# Altium footprint library ACR Components.PcbLib: 45 footprints (part 2 of 3)
Each footprint in its own frame and in the unit in brackets; x right, y up, seen from the top. Pads: shape width x height; smd on the part's side, far side on the other; paste and mask are expansions set on the pad; w line width, h text height; cw(c..) or ccw(c..) is an arc to the next point about the centre after c.
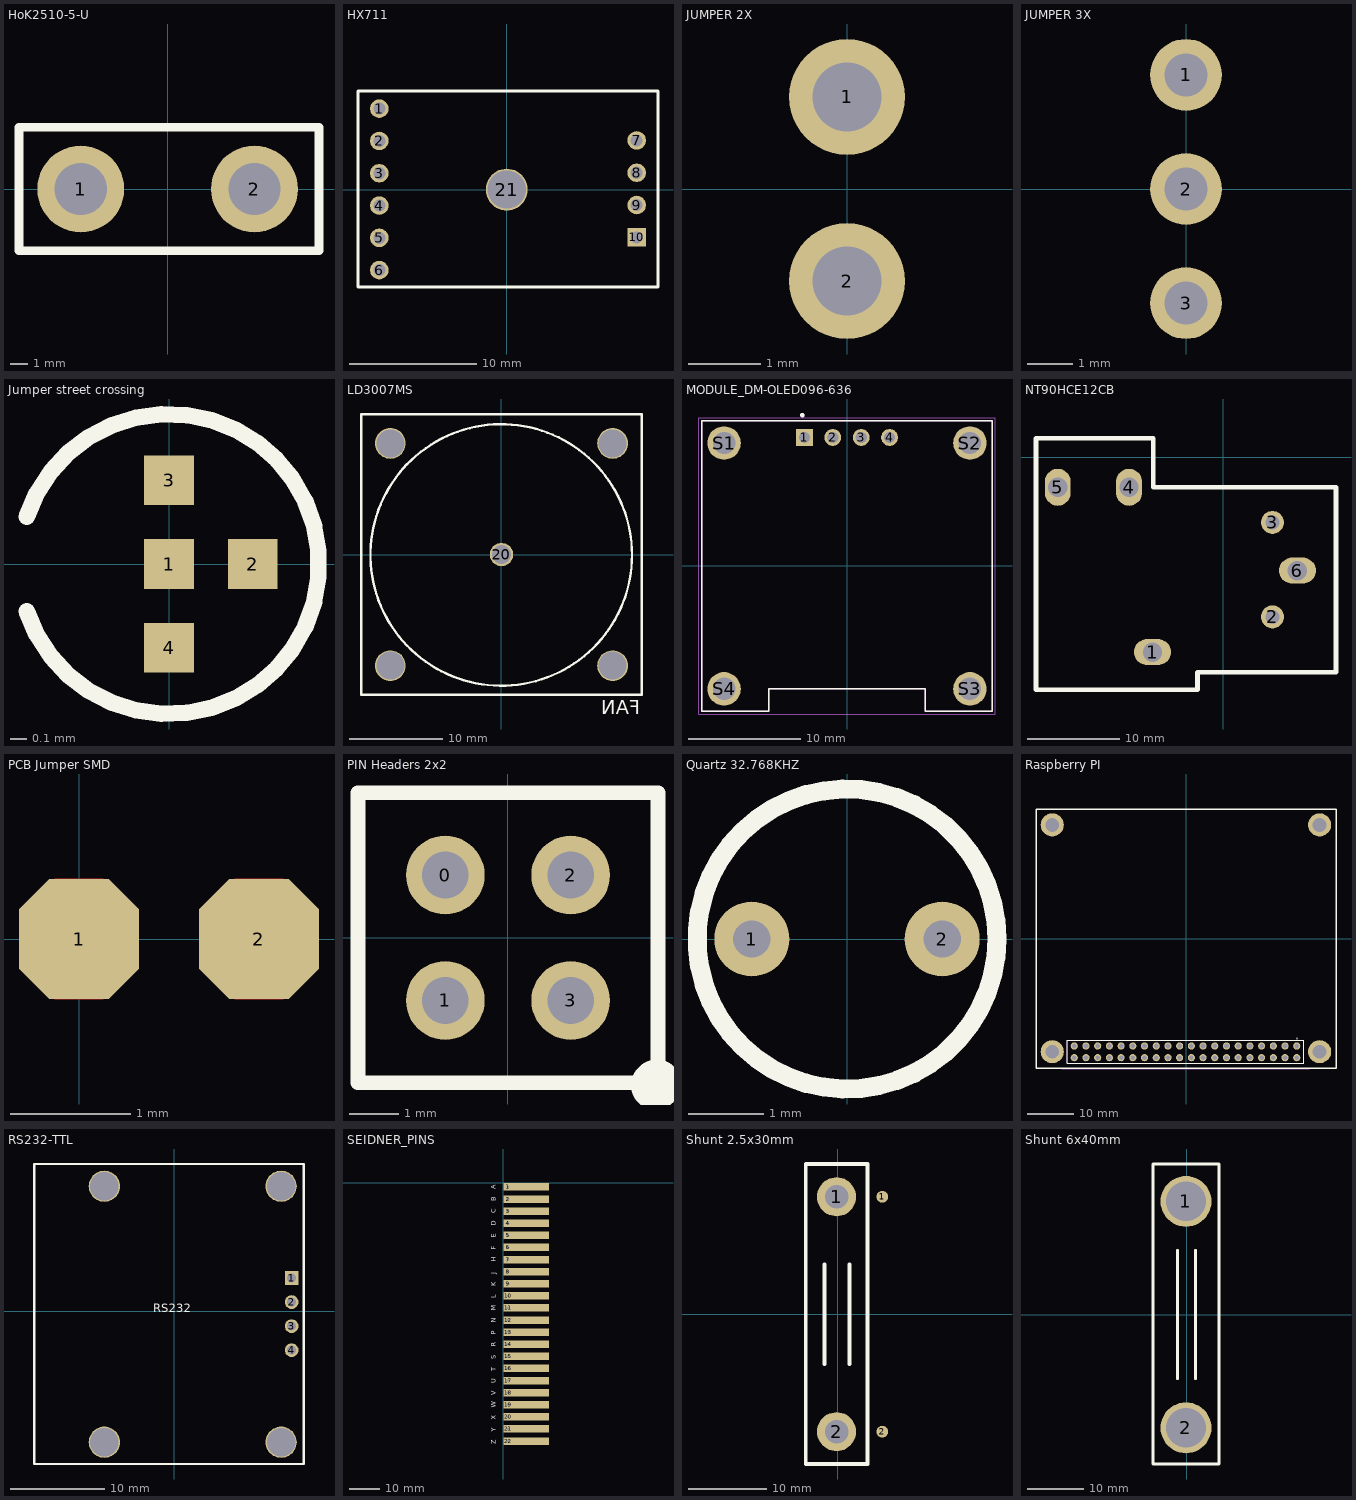
[diagram p1: the footprints below, top view; thin cyan lines are the x and y axes]

## HoK2510-5-U [mm] "Resistors/Chip Resistor - Surface Mount"
pads (2):
  round 5 hole 3: 1(-5,0) 2(5,0)
Top Overlay:
  lines w0.5: -8.556,-3.556 8.716,-3.556 8.716,3.556 -8.556,3.556 -8.556,-3.556
3D body "HoK2510-5-U.STEP": height 21.05, standoff -3.5, extent -6.6,-1.25 6.6,1.25

## HX711 [mm] "HX711 Strain Gauge Amplifier Module With Round Pin/Socket Headers"
pads (11):
  round 1.458 hole 0.95: 1(-10.025,6.37) 2(-10.025,3.83) 3(-10.025,1.29) 4(-10.025,-1.25) 5(-10.025,-3.79) 6(-10.025,-6.33) 7(10.225,3.87) 8(10.225,1.33) 9(10.225,-1.21)
  rect 1.458x1.458 hole 0.95: 10(10.225,-3.75)
  round 3.3 hole 3: 21(0,0)
Top Overlay:
  lines w0.254: -11.7,-7.65 11.9,-7.65 11.9,7.75 -11.7,7.75 -11.7,-7.65
3D body "HX711.step": height 11.5, standoff -2.3, extent -11.7,-7.65 11.9,7.75

## JUMPER 2X [mm]
pads (2):
  round 1.6 hole 0.95: 1(0,1.27) 2(0,-1.27)

## JUMPER 3X [mm]
pads (3):
  round 1.6 hole 0.95: 1(0,2.54) 2(0,0) 3(0,-2.54)

## Jumper street crossing [mm]
pads (4):
  rect 0.3x0.3 smd: 1(0,0) 2(0.508,0) 3(0,0.508) 4(0,-0.508)
Top Overlay:
  lines w0.1: -0.861,-0.287 ccw(c0,0) -0.861,0.287

## LD3007MS [mm] "LD3007MS FAN 5V Cooling fan for raspberry Pi"
pads (5):
  round 2.5 hole 2: 20(0,0)
  round 3.3 hole 3: ""(-11.9,-11.9) ""(-11.9,11.9) ""(11.9,-11.9) ""(11.9,11.9)
Top Overlay:
  circle w0.254: c-0.025,-0.046 r14
  lines w0.254: -15,-15 -15,15 15,15 15,-15 -15,-15
  text "FAN" at 14.871,-17.071 h1.52
Bottom Overlay:
  circle w0.254: c0,0 r14
  lines w0.254: -14.975,-14.954 15.025,-14.954 15.025,15.046 -14.975,15.046 -14.975,-14.954
  text "FAN" at -14.848,-16.95 h1.52
3D body "LD3007MS FAN.step": height 7.75, standoff -0.03, extent -15,-15 15,15

## MODULE_DM-OLED096-636 [mm]
height 11.3
pads (8):
  rect 1.508x1.508 / inner round 1.508 / far side rect 1.508x1.508 hole 1: 1(-3.81,11.5)
  round 1.508 hole 1: 2(-1.27,11.5) 3(1.27,11.5) 4(3.81,11.5)
  round 3 hole 2: S1(-11,11) S2(11,11) S3(11,-11) S4(-11,-11)
Top Overlay:
  circle w0.2: c-4,13.5 r0.1
  lines w0.127: -13,-13 -13,13 13,13 13,-13 7,-13 7,-11 -7,-11 -7,-13 -13,-13
Mechanical 13:
  circle w0.2: c-4,13.5 r0.1
  lines w0.127: -13,-13 -13,13 13,13 13,-13 7,-13 7,-11 -7,-11 -7,-13 -13,-13
Mechanical 15:
  lines w0.05: -13.25,-13.25 -13.25,13.25 13.25,13.25 13.25,-13.25 -13.25,-13.25
3D body "step_temp.STEP": height 5.66, standoff -5.64, extent -13,-13 13,13

## NT90HCE12CB [mm] "NT90HCE12CB RELAIS 12V 1RT 30A 6 PATTES"
pads (6):
  oval 4x2.8 hole 2.1: 1(-7.629,-21.043) 6(8.026,-12.243)
  round 2.5 hole 1.5: 2(5.331,-17.243) 3(5.331,-7.043)
  oval 2.8x4 hole 2.1: 4(-10.169,-3.243) 5(-17.869,-3.243)
Top Overlay:
  lines w0.5: -20.218,-25.121 -20.218,2.057 -7.569,2.057 -7.569,-3.243 12.192,-3.243 12.192,-23.243 -2.769,-23.243 -2.769,-25.121 -20.218,-25.121
3D body "NT90HCE12CB.STEP": height 2.7, standoff -18, extent -20.134,-25.314 12.366,2.286

## PCB Jumper SMD [mm]
pads (2):
  oct 1x1 smd: 1(0,0) 2(1.5,0)
Top Layer:
  region: 1.1,-0.3 1.3,-0.5 1.7,-0.5 1.9,-0.3 1.9,0.3 1.7,0.5 1.3,0.5 1.1,0.3
  region: -0.4,-0.3 -0.2,-0.5 0.2,-0.5 0.4,-0.3 0.4,0.3 0.2,0.5 -0.2,0.5 -0.4,0.3

## PIN Headers 2x2 [mm]
pads (4):
  round 1.6 hole 0.95: 0(-1.275,1.275) 1(-1.275,-1.275) 2(1.275,1.275) 3(1.275,-1.275)
Top Overlay:
  lines w0.3: -3.05,2.925 -3.05,-2.95 3.025,-2.95 ; -3.05,2.95 3.05,2.95 3.05,-2.925
  lines w1: 3,-3 3.025,-2.975

## Quartz 32.768KHZ [mm]
pads (2):
  round 1 hole 0.5: 1(-1.27,0) 2(1.27,0)
Top Overlay:
  circle w0.254: c0,0 r2
3D body "Quartz Oscillateur.STEP": height 10.03, standoff -2.02, extent -1.489,-1.5 1.489,1.5

## Raspberry PI [mm]
pads (44):
  round 1.55 hole 1.02: 1(24.022,-23.26) 2(24.022,-25.8) 3(21.482,-23.26) 4(21.482,-25.8) 5(18.942,-23.26) 6(18.942,-25.8) 7(16.402,-23.26) 8(16.402,-25.8) 9(13.862,-23.26) 10(13.862,-25.8) 11(11.322,-23.26) 12(11.322,-25.8) 13(8.782,-23.26) 14(8.782,-25.8) 15(6.242,-23.26) 16(6.242,-25.8) 17(3.702,-23.26) 18(3.702,-25.8) 19(1.162,-23.26) 20(1.162,-25.8) 21(-1.378,-23.26) 22(-1.378,-25.8) 23(-3.918,-23.26) 24(-3.918,-25.8) 25(-6.458,-23.26) 26(-6.458,-25.8) 27(-8.998,-23.26) 28(-8.998,-25.8) 29(-11.538,-23.26) 30(-11.538,-25.8) 31(-14.078,-23.26) 32(-14.078,-25.8) 33(-16.618,-23.26) 34(-16.618,-25.8) 35(-19.158,-23.26) 36(-19.158,-25.8) 37(-21.698,-23.26) 38(-21.698,-25.8) 39(-24.238,-23.26) 40(-24.238,-25.8)
  round 5 hole 3: ""(-29.012,-24.5) ""(-29.012,24.7) ""(28.988,-24.5) ""(28.988,24.7)
Top Overlay:
  circle w0.2: c24.072,-21.61 r0.05
  lines w0.1: -25.763,-27.005 -25.763,-22.055 25.547,-22.055 25.547,-27.005 -25.763,-27.005
  lines w0.3: -32.537,-28.1 -32.537,28.1 32.537,28.1 32.537,-28.1 -32.537,-28.1
  lines w1: 28.987,24.7 28.987,24.7 ; 28.987,24.7 28.988,24.7
Mechanical 13:
  lines w0.2: -25.763,-27.005 -25.763,-22.055 25.547,-22.055 25.547,-27.005 -25.763,-27.005
Mechanical 15:
  lines w0.05: -26.963,-28.205 26.747,-28.205
3D body "SSQ-120-01-F-D.stp": height 8.51, standoff -2.64, extent -25.763,-26.977 25.545,-22.023

## RS232-TTL [mm] "RS232 to TTL Serial Converter  This is a MAX3232-based level shifter for converting TTL-level serial to standard RS-232 serial. This will allow a microcontroller to communicate with a computer"
pads (8):
  rect 1.458x1.458 hole 0.95: 1(12.41,3.493)
  round 1.458 hole 0.95: 2(12.41,0.953) 3(12.41,-1.587) 4(12.41,-4.127)
  round 3.3 hole 3 unplated: ""(-7.385,-13.85) ""(-7.385,13.2) ""(11.3,-13.85) ""(11.3,13.2)
Top Overlay:
  lines w0.254: -14.775,-16.15 -14.775,15.55 13.675,15.55 13.675,-16.15 -14.775,-16.15
  text "RS232" at -2.225,-0.425 h1.52
Bottom Overlay:
  text "RS232" at 1.75,-0.425 h1.52
3D body "RS232 TO TTL.stp": height 14.41, standoff -2.09, extent -21.075,-16.15 13.675,15.55

## SEIDNER_PINS [mm]
pads (22):
  rect 15x2.45 hole 0.95 copper offset 6,0: 1(1.6,-1.325) 2(1.6,-5.288) 3(1.6,-9.251) 4(1.6,-13.214) 5(1.6,-17.177) 6(1.6,-21.14) 7(1.6,-25.104) 8(1.6,-29.067) 9(1.6,-33.03) 10(1.6,-36.993) 11(1.6,-40.956) 12(1.6,-44.919) 13(1.6,-48.882) 14(1.6,-52.845) 15(1.6,-56.808) 16(1.6,-60.771) 17(1.6,-64.735) 18(1.6,-68.698) 19(1.6,-72.661) 20(1.6,-76.624) 21(1.6,-80.587) 22(1.6,-84.55)
Top Overlay:
  text "A" at -2.379,-2.046 h1.52
  text "B" at -2.379,-6.021 h1.52
  text "C" at -2.379,-9.996 h1.52
  text "D" at -2.379,-13.971 h1.52
  text "E" at -2.379,-17.946 h1.52
  text "F" at -2.379,-21.921 h1.52
  text "H" at -2.379,-25.896 h1.52
  text "J" at -2.379,-29.871 h1.52
  text "K" at -2.379,-33.846 h1.52
  text "L" at -2.379,-37.821 h1.52
  text "M" at -2.379,-41.796 h1.52
  text "N" at -2.379,-45.771 h1.52
  text "P" at -2.379,-49.746 h1.52
  text "R" at -2.379,-53.721 h1.52
  text "S" at -2.379,-57.696 h1.52
  text "T" at -2.379,-61.671 h1.52
  text "U" at -2.379,-65.646 h1.52
  text "V" at -2.379,-69.621 h1.52
  text "W" at -2.379,-73.596 h1.52
  text "X" at -2.379,-77.571 h1.52
  text "Y" at -2.379,-81.546 h1.52
  text "Z" at -2.379,-85.521 h1.52

## Shunt 2.5x30mm [mm]
pads (4):
  round 5 hole 3: 1(-0.127,15) 2(-0.127,-15)
  round 1.5 smd: 1(5.715,15) 2(5.715,-15)
Top Overlay:
  lines w0.5: -1.651,-6.336 -1.651,6.364 ; 1.524,-6.336 1.524,6.364 ; -4.064,-19.13 -4.064,19.191 3.81,19.191 3.81,-19.13 -4.064,-19.13
3D body "Shunt 2.5x30mm.STEP": height 13.25, standoff -3, extent -1.377,-16.25 1.123,16.25

## Shunt 6x40mm [mm]
pads (2):
  round 9 hole 7: 1(-0.127,20) 2(-0.127,-20)
Top Overlay:
  lines w0.5: -1.651,-11.336 -1.651,11.364 ; 1.524,-11.336 1.524,11.364 ; -5.969,-26.388 -5.969,26.604 5.715,26.604 5.715,-26.388 -5.969,-26.388
3D body "Shunt 6x40mm.STEP": height 20, standoff -3, extent -3.127,-23 2.873,23